# Altium footprint library IFAT6.PcbLib: 65 footprints (part 3 of 5)
Each footprint in its own frame and in the unit in brackets; x right, y up, seen from the top. Pads: shape width x height; smd on the part's side, far side on the other; paste and mask are expansions set on the pad; w line width, h text height; cw(c..) or ccw(c..) is an arc to the next point about the centre after c.
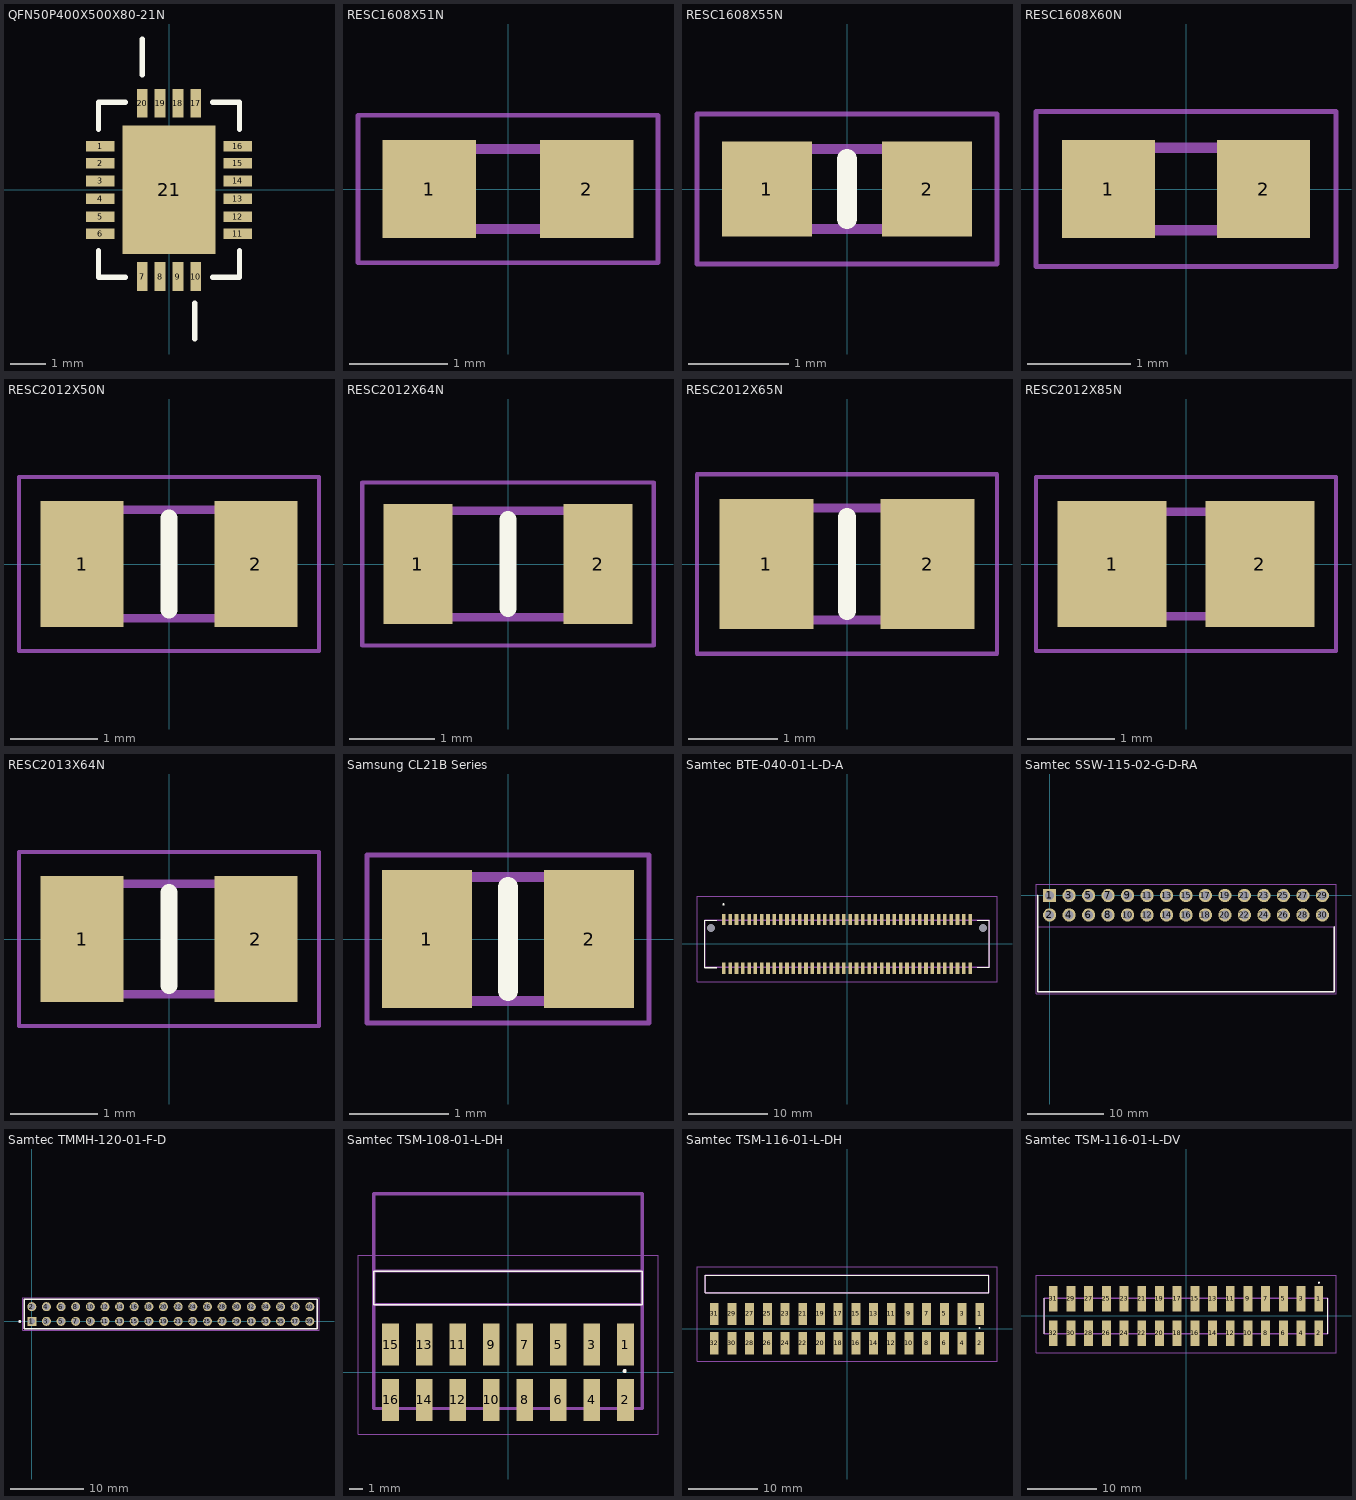
[diagram p2: the footprints below, top view; thin cyan lines are the x and y axes]

## QFN50P400X500X80-21N [mil]
pads (21):
  rect 32x12 smd: 1(-77,49) 2(-77,30) 3(-77,10) 4(-77,-10) 5(-77,-30) 6(-77,-49) 11(77,-49) 12(77,-30) 13(77,-10) 14(77,10) 15(77,30) 16(77,49)
  rect 12x32 smd: 7(-30,-97) 8(-10,-97) 9(10,-97) 10(30,-97) 17(30,97) 18(10,97) 19(-10,97) 20(-30,97)
  rect 104x144 smd: 21(0,0)
Top Overlay:
  lines w6: -79,-68 -79,-98 -49,-98 ; -79,68 -79,98 -49,98 ; -30,129 -30,169 ; 29,-167 29,-127 ; 49,-98 79,-98 79,-68 ; 49,98 79,98 79,68

## RESC1608X51N [mm]
pads (2):
  rect 0.95x1 smd: 1(-0.8,0) 2(0.8,0)
Mechanical 13:
  lines w0.1: -0.813,-0.406 -0.813,0.406 0.813,0.406 0.813,-0.406 -0.813,-0.406
Mechanical 15:
  lines w0.05: -1.525,-0.75 -1.525,0.75 1.525,0.75 1.525,-0.75 -1.525,-0.75
3D body "PLTU0603U8001LST5.stp": height 0.51, standoff 0, extent -0.813,-0.406 0.813,0.406

## RESC1608X55N [mm]
pads (2):
  rect 0.9x0.95 smd: 1(-0.8,0) 2(0.8,0)
Top Overlay:
  lines w0.2: 0,-0.3 0,0.3
Mechanical 13:
  lines w0.1: -0.8,-0.4 -0.8,0.4 0.8,0.4 0.8,-0.4 -0.8,-0.4
Mechanical 15:
  lines w0.05: -1.5,-0.75 -1.5,0.75 1.5,0.75 1.5,-0.75 -1.5,-0.75
3D body "CR0603-FX-2701ELF.stp": height 0.55, standoff 0, extent -0.8,-0.4 0.8,0.4

## RESC1608X60N [mm]
pads (2):
  rect 0.9x0.95 smd: 1(-0.75,0) 2(0.75,0)
Mechanical 13:
  lines w0.1: -0.775,-0.4 -0.775,0.4 0.775,0.4 0.775,-0.4 -0.775,-0.4
Mechanical 15:
  lines w0.05: -1.45,-0.75 -1.45,0.75 1.45,0.75 1.45,-0.75 -1.45,-0.75
3D body "CRT0603-BY-1002ELF.stp": height 0.6, standoff 0, extent -0.775,-0.4 0.775,0.4

## RESC2012X50N [mm]
pads (2):
  rect 0.95x1.45 smd: 1(-1,0) 2(1,0)
Top Overlay:
  lines w0.2: 0,-0.525 0,0.525
Mechanical 13:
  lines w0.1: -1.025,-0.625 -1.025,0.625 1.025,0.625 1.025,-0.625 -1.025,-0.625
Mechanical 15:
  lines w0.05: -1.725,-1 -1.725,1 1.725,1 1.725,-1 -1.725,-1
3D body "CRCW08054K00FKTA.stp": height 0.5, standoff 0, extent -1.025,-0.625 1.025,0.625

## RESC2012X64N [mm]
pads (2):
  rect 0.8x1.4 smd: 1(-1.05,0) 2(1.05,0)
Top Overlay:
  lines w0.2: 0,-0.52 0,0.52
Mechanical 13:
  lines w0.1: -1.005,-0.62 -1.005,0.62 1.005,0.62 1.005,-0.62 -1.005,-0.62
Mechanical 15:
  lines w0.05: -1.7,-0.95 -1.7,0.95 1.7,0.95 1.7,-0.95 -1.7,-0.95
3D body "Y16291K00000T9R.stp": height 0.64, standoff 0, extent -1.005,-0.62 1.005,0.62

## RESC2012X65N [mm]
pads (2):
  rect 1.05x1.45 smd: 1(-0.9,0) 2(0.9,0)
Top Overlay:
  lines w0.2: 0,-0.525 0,0.525
Mechanical 13:
  lines w0.1: -1,-0.625 -1,0.625 1,0.625 1,-0.625 -1,-0.625
Mechanical 15:
  lines w0.05: -1.675,-1 -1.675,1 1.675,1 1.675,-1 -1.675,-1
3D body "RN73C2A4K02BTD.stp": height 0.65, standoff 0, extent -1,-0.625 1,0.625

## RESC2012X85N [mm]
pads (2):
  rect 1.25x1.45 smd: 1(-0.85,0) 2(0.85,0)
Mechanical 13:
  lines w0.1: -1,-0.6 -1,0.6 1,0.6 1,-0.6 -1,-0.6
Mechanical 15:
  lines w0.05: -1.725,-1 -1.725,1 1.725,1 1.725,-1 -1.725,-1
3D body "HCJ0805ZT0R00.stp": height 0.85, standoff 0, extent -1,-0.6 1,0.6

## RESC2013X64N [mm]
pads (2):
  rect 0.95x1.45 smd: 1(-1,0) 2(1,0)
Top Overlay:
  lines w0.2: 0,-0.535 0,0.535
Mechanical 13:
  lines w0.1: -1.015,-0.635 -1.015,0.635 1.015,0.635 1.015,-0.635 -1.015,-0.635
Mechanical 15:
  lines w0.05: -1.725,-1 -1.725,1 1.725,1 1.725,-1 -1.725,-1
3D body "Y162410K0000T9R.stp": height 0.64, standoff 0, extent -1.015,-0.635 1.015,0.635

## Samsung CL21B Series [mm] "CAP 0805"
pads (2):
  rect 0.91x1.39 smd: 1(-0.82,0) 2(0.82,0)
Top Overlay:
  lines w0.2: 0,-0.525 0,0.525
Mechanical 13:
  lines w0.1: -1,-0.625 1,-0.625 1,0.625 -1,0.625 -1,-0.625
Mechanical 15:
  lines w0.05: -1.425,-0.85 1.425,-0.85 1.425,0.85 -1.425,0.85 -1.425,-0.85
3D body "CL21B102KBANFNC.stp": height 0.75, standoff 0, extent -1,-0.625 1,0.625

## Samtec BTE-040-01-L-D-A [mm]
pads (82):
  rect 0.457x1.448 smd: 1(-15.6,3.086) 2(-15.6,-3.086) 3(-14.8,3.086) 4(-14.8,-3.086) 5(-14,3.086) 6(-14,-3.086) 7(-13.2,3.086) 8(-13.2,-3.086) 9(-12.4,3.086) 10(-12.4,-3.086) 11(-11.6,3.086) 12(-11.6,-3.086) 13(-10.8,3.086) 14(-10.8,-3.086) 15(-10,3.086) 16(-10,-3.086) 17(-9.2,3.086) 18(-9.2,-3.086) 19(-8.4,3.086) 20(-8.4,-3.086) 21(-7.6,3.086) 22(-7.6,-3.086) 23(-6.8,3.086) 24(-6.8,-3.086) 25(-6,3.086) 26(-6,-3.086) 27(-5.2,3.086) 28(-5.2,-3.086) 29(-4.4,3.086) 30(-4.4,-3.086) 31(-3.6,3.086) 32(-3.6,-3.086) 33(-2.8,3.086) 34(-2.8,-3.086) 35(-2,3.086) 36(-2,-3.086) 37(-1.2,3.086) 38(-1.2,-3.086) 39(-0.4,3.086) 40(-0.4,-3.086) 41(0.4,3.086) 42(0.4,-3.086) 43(1.2,3.086) 44(1.2,-3.086) 45(2,3.086) 46(2,-3.086) 47(2.8,3.086) 48(2.8,-3.086) 49(3.6,3.086) 50(3.6,-3.086) 51(4.4,3.086) 52(4.4,-3.086) 53(5.2,3.086) 54(5.2,-3.086) 55(6,3.086) 56(6,-3.086) 57(6.8,3.086) 58(6.8,-3.086) 59(7.6,3.086) 60(7.6,-3.086) 61(8.4,3.086) 62(8.4,-3.086) 63(9.2,3.086) 64(9.2,-3.086) 65(10,3.086) 66(10,-3.086) 67(10.8,3.086) 68(10.8,-3.086) 69(11.6,3.086) 70(11.6,-3.086) 71(12.4,3.086) 72(12.4,-3.086) 73(13.2,3.086) 74(13.2,-3.086) 75(14,3.086) 76(14,-3.086) 77(14.8,3.086) 78(14.8,-3.086) 79(15.6,3.086) 80(15.6,-3.086)
  round 0.508 hole 1.016 unplated: MH1(-17.238,2.032) MH2(17.238,2.032)
Top Overlay:
  lines w0.1: -18,-3 -18,3 ; -18,-3 -18,3 ; -18,-3 -16.5,-3 -16.5,-2.984 -18,-2.984 -18,-3 ; -18,3 -16.5,3 -18,3 ; 18,-2.984 16.5,-2.984 18,-2.984 ; 18,-2.984 18,2.985 ; 18,-2.984 18,2.985 ; 18,2.985 16.5,2.985 18,2.985
  lines w0.2: -15.7,5 ccw(c-15.65,5) -15.6,5 ; -15.7,5 cw(c-15.65,5) -15.6,5 ; -15.7,5 ccw(c-15.65,5) -15.6,5
Mechanical 13:
  lines w0.2: -18,-2.984 18,-2.984 18,2.985 -18,2.985 -18,-2.984
Mechanical 15:
  lines w0.1: -19,-4.81 19,-4.81 19,6.05 -19,6.05 -19,-4.81
3D body "BTE-040-01-L-D-A.stp": height 4.16, standoff -1.7, extent -18,-3.764 18,3.764

## Samtec SSW-115-02-G-D-RA [mm] "CONN RCPT 30POS 0.1 GOLD PCB R/A"
pads (30):
  rect 1.725x1.725 hole 1.15: 1(0,0)
  round 1.725 hole 1.15: 2(0,-2.54) 3(2.54,0) 4(2.54,-2.54) 5(5.08,0) 6(5.08,-2.54) 7(7.62,0) 8(7.62,-2.54) 9(10.16,0) 10(10.16,-2.54) 11(12.7,0) 12(12.7,-2.54) 13(15.24,0) 14(15.24,-2.54) 15(17.78,0) 16(17.78,-2.54) 17(20.32,0) 18(20.32,-2.54) 19(22.86,0) 20(22.86,-2.54) 21(25.4,0) 22(25.4,-2.54) 23(27.94,0) 24(27.94,-2.54) 25(30.48,0) 26(30.48,-2.54) 27(33.02,0) 28(33.02,-2.54) 29(35.56,0) 30(35.56,-2.54)
Top Overlay:
  lines w0.2: -1.525,0 -1.525,-12.57 37.085,-12.57 37.085,-4.06
Mechanical 13:
  lines w0.1: -1.525,-12.57 -1.525,-4.06 37.085,-4.06 37.085,-12.57 -1.525,-12.57
Mechanical 15:
  lines w0.05: -1.775,-12.82 -1.775,1.475 37.335,1.475 37.335,-12.82 -1.775,-12.82
3D body "SSW-115-02-G-D-RA-030.stp": height 4.95, standoff -2.54, extent -1.525,-12.57 37.085,0.395

## Samtec TMMH-120-01-F-D [mm] "2MM LOW PROFILE STRIPS"
pads (40):
  rect 1.239x1.239 hole 0.889: 1(0,0)
  round 1.239 hole 0.889: 2(0,2) 3(2,0) 4(2,2) 5(4,0) 6(4,2) 7(6,0) 8(6,2) 9(8,0) 10(8,2) 11(10,0) 12(10,2) 13(12,0) 14(12,2) 15(14,0) 16(14,2) 17(16,0) 18(16,2) 19(18,0) 20(18,2) 21(20,0) 22(20,2) 23(22,0) 24(22,2) 25(24,0) 26(24,2) 27(26,0) 28(26,2) 29(28,0) 30(28,2) 31(30,0) 32(30,2) 33(32,0) 34(32,2) 35(34,0) 36(34,2) 37(36,0) 38(36,2) 39(38,0) 40(38,2)
Top Overlay:
  circle w0.2: c-1.65,0 r0.1
  lines w0.2: -1,-0.995 39,-0.995 39,2.995 -1,2.995 -1,-0.995
Mechanical 13:
  circle w0.2: c-1.65,0 r0.1
  lines w0.1: -1,-0.995 39,-0.995 39,2.995 -1,2.995 -1,-0.995
Mechanical 15:
  lines w0.05: -1.25,-1.245 39.25,-1.245 39.25,3.245 -1.25,3.245 -1.25,-1.245
3D body "TMMH-120-01-F-D.stp": height 5.21, standoff -2.46, extent -1,-0.995 39,2.993

## Samtec TSM-108-01-L-DH [mm] "CONN HEADER SMD R/A 16POS 2.54MM"
pads (16):
  rect 1.27x3.18 smd: 1(8.89,2.095) 2(8.89,-2.095) 3(6.35,2.095) 4(6.35,-2.095) 5(3.81,2.095) 6(3.81,-2.095) 7(1.27,2.095) 8(1.27,-2.095) 9(-1.27,2.095) 10(-1.27,-2.095) 11(-3.81,2.095) 12(-3.81,-2.095) 13(-6.35,2.095) 14(-6.35,-2.095) 15(-8.89,2.095) 16(-8.89,-2.095)
Top Overlay:
  circle w0.2: c8.84,0.095 r0.05
  lines w0.1: -10.16,5.13 -10.16,7.67 10.16,7.67 10.16,5.13 -10.16,5.13
Mechanical 1:
  lines w0.254: -10.16,-2.744 10.16,-2.744 10.16,13.512 ; -10.16,-2.744 -10.16,-2.744 ; -10.16,-2.744 -10.16,13.512 10.16,13.512 ; 10.16,13.512 10.16,13.512
Mechanical 13:
  lines w0.2: -10.16,5.13 -10.16,7.67 10.16,7.67 10.16,5.13 -10.16,5.13
Mechanical 15:
  lines w0.05: -11.36,-4.685 -11.36,8.87 11.36,8.87 11.36,-4.685 -11.36,-4.685
3D body "TSM-108-01-S-DH.stp": height 6.1, standoff 0, extent -10.16,-2.744 10.16,13.512

## Samtec TSM-116-01-L-DH [mm] "CONN HEADER SMD R/A 32POS 2.54MM"
pads (32):
  rect 1.27x3.18 smd: 1(19.05,2.095) 2(19.05,-2.095) 3(16.51,2.095) 4(16.51,-2.095) 5(13.97,2.095) 6(13.97,-2.095) 7(11.43,2.095) 8(11.43,-2.095) 9(8.89,2.095) 10(8.89,-2.095) 11(6.35,2.095) 12(6.35,-2.095) 13(3.81,2.095) 14(3.81,-2.095) 15(1.27,2.095) 16(1.27,-2.095) 17(-1.27,2.095) 18(-1.27,-2.095) 19(-3.81,2.095) 20(-3.81,-2.095) 21(-6.35,2.095) 22(-6.35,-2.095) 23(-8.89,2.095) 24(-8.89,-2.095) 25(-11.43,2.095) 26(-11.43,-2.095) 27(-13.97,2.095) 28(-13.97,-2.095) 29(-16.51,2.095) 30(-16.51,-2.095) 31(-19.05,2.095) 32(-19.05,-2.095)
Top Overlay:
  circle w0.2: c19,0.095 r0.05
  lines w0.1: -20.32,5.13 -20.32,7.67 20.32,7.67 20.32,5.13 -20.32,5.13
Mechanical 13:
  lines w0.2: -20.32,5.13 -20.32,7.67 20.32,7.67 20.32,5.13 -20.32,5.13
Mechanical 15:
  lines w0.05: -21.52,-4.685 -21.52,8.87 21.52,8.87 21.52,-4.685 -21.52,-4.685
3D body "TSM-116-01-L-DH.stp": height 6.1, standoff 0, extent -20.32,-2.744 20.32,13.512

## Samtec TSM-116-01-L-DV [mm] "CONN HEADER SMD 32POS 2.54MM"
pads (32):
  rect 1.27x3.68 smd: 1(19.05,2.475) 2(19.05,-2.475) 3(16.51,2.475) 4(16.51,-2.475) 5(13.97,2.475) 6(13.97,-2.475) 7(11.43,2.475) 8(11.43,-2.475) 9(8.89,2.475) 10(8.89,-2.475) 11(6.35,2.475) 12(6.35,-2.475) 13(3.81,2.475) 14(3.81,-2.475) 15(1.27,2.475) 16(1.27,-2.475) 17(-1.27,2.475) 18(-1.27,-2.475) 19(-3.81,2.475) 20(-3.81,-2.475) 21(-6.35,2.475) 22(-6.35,-2.475) 23(-8.89,2.475) 24(-8.89,-2.475) 25(-11.43,2.475) 26(-11.43,-2.475) 27(-13.97,2.475) 28(-13.97,-2.475) 29(-16.51,2.475) 30(-16.51,-2.475) 31(-19.05,2.475) 32(-19.05,-2.475)
Top Overlay:
  circle w0.2: c19.1,4.775 r0.05
  lines w0.1: -20.32,-2.54 -20.32,2.54 ; 20.32,-2.54 20.32,2.54
Mechanical 13:
  lines w0.2: -20.32,-2.54 -20.32,2.54 20.32,2.54 20.32,-2.54 -20.32,-2.54
Mechanical 15:
  lines w0.05: -21.52,-5.315 -21.52,5.875 21.52,5.875 21.52,-5.315 -21.52,-5.315
3D body "TSM-116-01-L-DV.stp": height 9.66, standoff 0.01, extent -20.32,-3.848 20.32,3.848